# Altium footprint library Connector.PcbLib: 59 footprints (part 1 of 4)
Each footprint in its own frame and in the unit in brackets; x right, y up, seen from the top. Pads: shape width x height; smd on the part's side, far side on the other; paste and mask are expansions set on the pad; w line width, h text height; cw(c..) or ccw(c..) is an arc to the next point about the centre after c.
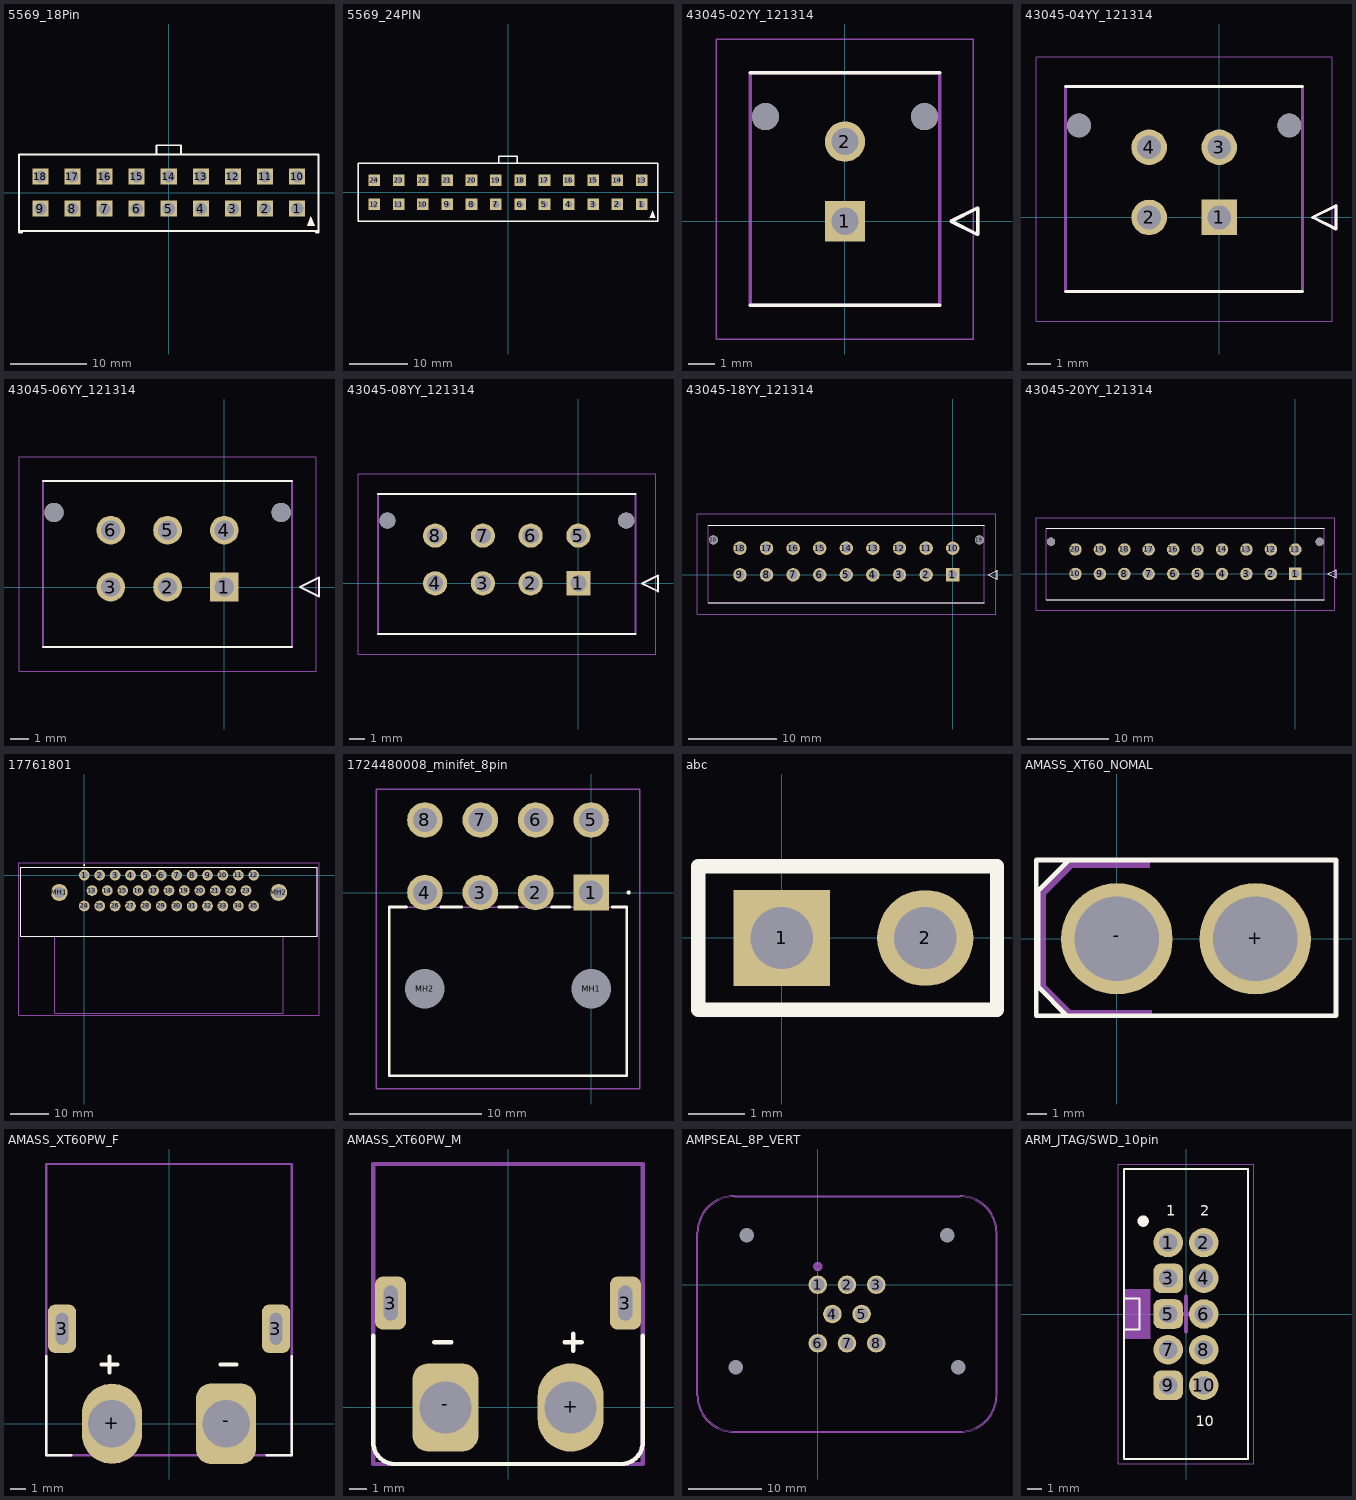
[diagram p0: the footprints below, top view; thin cyan lines are the x and y axes]

## 5569_18Pin [mm] "5569直插18PIN"
pads (18):
  rect 2.1x2.1 hole 1.6: 1(16.8,-2.1) 2(12.6,-2.1) 3(8.4,-2.1) 4(4.2,-2.1) 5(0,-2.1) 6(-4.2,-2.1) 7(-8.4,-2.1) 8(-12.6,-2.1) 9(-16.8,-2.1) 10(16.8,2.1) 11(12.6,2.1) 12(8.4,2.1) 13(4.2,2.1) 14(0,2.1) 15(-4.2,2.1) 16(-8.4,2.1) 17(-12.6,2.1) 18(-16.8,2.1)
Top Overlay:
  region: 18.093,-4.318 19.093,-4.318 18.593,-3.118
  lines w0.254: -19.6,-5 19.6,-5 ; -19.202,-5 -19.202,-5.258 -19.6,-5.258 -19.6,5 19.6,5 19.6,-3.97 ; -1.625,5 -1.625,6.2 1.625,6.2 1.625,5 ; 19.25,-5 19.25,-5.232 19.6,-5.232 19.6,-4
Mechanical 15:
  region: -4.52,2.42 -3.88,2.42 -3.88,1.78 -4.52,1.78
  region: -0.32,2.42 0.32,2.42 0.32,1.78 -0.32,1.78
  region: 3.88,2.42 4.52,2.42 4.52,1.78 3.88,1.78
  region: 3.88,2.42 4.52,2.42 4.52,1.78 3.88,1.78
  region: 8.08,2.42 8.72,2.42 8.72,1.78 8.08,1.78
  region: 12.28,2.42 12.92,2.42 12.92,1.78 12.28,1.78
  region: 16.48,2.42 17.12,2.42 17.12,1.78 16.48,1.78
  region: -17.12,-1.78 -16.48,-1.78 -16.48,-2.42 -17.12,-2.42
  region: -12.92,-1.78 -12.28,-1.78 -12.28,-2.42 -12.92,-2.42
  region: -8.72,-1.78 -8.08,-1.78 -8.08,-2.42 -8.72,-2.42
  region: -4.52,-1.78 -3.88,-1.78 -3.88,-2.42 -4.52,-2.42
  region: -0.32,-1.78 0.32,-1.78 0.32,-2.42 -0.32,-2.42
  region: 3.88,-1.78 4.52,-1.78 4.52,-2.42 3.88,-2.42
  region: 8.08,-1.78 8.72,-1.78 8.72,-2.42 8.08,-2.42
  region: 12.28,-1.78 12.92,-1.78 12.92,-2.42 12.28,-2.42
  region: 16.48,-1.78 17.12,-1.78 17.12,-2.42 16.48,-2.42
  region: -8.72,2.42 -8.08,2.42 -8.08,1.78 -8.72,1.78
  region: -12.92,2.42 -12.28,2.42 -12.28,1.78 -12.92,1.78
  region: 19.66,-5 19.66,-4.975 19.625,-4.94 19.575,-4.94 19.54,-4.975 19.54,-5 19.54,-5.025 19.575,-5.06 19.625,-5.06 19.66,-5.025 19.66,-5
  lines w0.051: -1.626,5 -19.6,5 -19.6,-5 19.6,-5.012 ; -1.626,5.004 -1.626,6.2 1.626,6.2 1.626,5.004 ; 1.626,5 19.6,5 19.6,-5

## 5569_24PIN [mm] "5569直插24pin"
pads (24):
  rect 2x2 hole 1.2 square: 1(23.1,-2.1) 2(18.9,-2.1) 3(14.7,-2.1) 4(10.5,-2.1) 5(6.3,-2.1) 6(2.1,-2.1) 7(-2.1,-2.1) 8(-6.3,-2.1) 9(-10.5,-2.1) 10(-14.7,-2.1) 11(-18.9,-2.1) 12(-23.1,-2.1) 13(23.1,2.1) 14(18.9,2.1) 15(14.7,2.1) 16(10.5,2.1) 17(6.3,2.1) 18(2.1,2.1) 19(-2.1,2.1) 20(-6.3,2.1) 21(-10.5,2.1) 22(-14.7,2.1) 23(-18.9,2.1) 24(-23.1,2.1)
Top Overlay:
  region: 24.468,-4.42 25.468,-4.42 24.968,-3.22
  lines w0.254: -1.625,5 -1.625,6.2 1.625,6.2 1.625,5 ; -25.9,-5 -25.9,5 25.9,5 25.9,-5 -25.9,-5
Mechanical 15:
  region: 19.66,-5 19.66,-4.975 19.625,-4.94 19.575,-4.94 19.54,-4.975 19.54,-5 19.54,-5.025 19.575,-5.06 19.625,-5.06 19.66,-5.025 19.66,-5
  region: 22.78,-1.78 23.42,-1.78 23.42,-2.42 22.78,-2.42
  region: 22.78,2.42 23.42,2.42 23.42,1.78 22.78,1.78
  region: 18.58,-1.78 19.22,-1.78 19.22,-2.42 18.58,-2.42
  region: 18.58,2.42 19.22,2.42 19.22,1.78 18.58,1.78
  region: 14.38,-1.78 15.02,-1.78 15.02,-2.42 14.38,-2.42
  region: 14.38,2.42 15.02,2.42 15.02,1.78 14.38,1.78
  region: 10.18,-1.78 10.82,-1.78 10.82,-2.42 10.18,-2.42
  region: 10.18,2.42 10.82,2.42 10.82,1.78 10.18,1.78
  region: 10.18,2.42 10.82,2.42 10.82,1.78 10.18,1.78
  region: 5.98,-1.78 6.62,-1.78 6.62,-2.42 5.98,-2.42
  region: 5.98,2.42 6.62,2.42 6.62,1.78 5.98,1.78
  region: 1.78,-1.78 2.42,-1.78 2.42,-2.42 1.78,-2.42
  region: 1.78,2.42 2.42,2.42 2.42,1.78 1.78,1.78
  region: -2.42,2.42 -1.78,2.42 -1.78,1.78 -2.42,1.78
  region: -2.42,-1.78 -1.78,-1.78 -1.78,-2.42 -2.42,-2.42
  region: -6.62,2.42 -5.98,2.42 -5.98,1.78 -6.62,1.78
  region: -6.62,-1.78 -5.98,-1.78 -5.98,-2.42 -6.62,-2.42
  region: -10.82,-1.78 -10.18,-1.78 -10.18,-2.42 -10.82,-2.42
  region: -10.82,2.42 -10.18,2.42 -10.18,1.78 -10.82,1.78
  region: -15.02,-1.78 -14.38,-1.78 -14.38,-2.42 -15.02,-2.42
  region: -15.02,2.42 -14.38,2.42 -14.38,1.78 -15.02,1.78
  region: -19.22,-1.78 -18.58,-1.78 -18.58,-2.42 -19.22,-2.42
  region: -19.22,2.42 -18.58,2.42 -18.58,1.78 -19.22,1.78
  region: -23.42,-1.78 -22.78,-1.78 -22.78,-2.42 -23.42,-2.42
  region: -23.42,2.42 -22.78,2.42 -22.78,1.78 -23.42,1.78
  lines w0.051: -1.626,5 -25.908,5 -25.908,-4.998 25.908,-5.014 25.908,5 1.626,5 ; -1.626,5.004 -1.626,6.2 1.626,6.2 1.626,5.004

## 43045-02YY_121314 [mm]
pads (4):
  rect 1.52x1.52 hole 1.02: 1(0,0)
  round 1.52 hole 1.02: 2(0,3)
  round 1.02 hole 1.02 unplated: ""(-3,3.94) ""(3,3.94)
Top Overlay:
  lines w0.127: -3.575,-3.17 3.575,-3.17 ; -3.575,5.6 3.575,5.6 ; 4,0 5,-0.5 5,0.5 4,0
Mechanical 13:
  lines w0.127: -3.575,-3.17 3.575,-3.17 3.575,5.6 -3.575,5.6 -3.575,-3.17 ; 4,0 5,-0.5 5,0.5 4,0
Mechanical 15:
  lines w0.05: -4.845,-4.44 4.845,-4.44 4.845,6.87 -4.845,6.87 -4.845,-4.44
3D body "43045-0212.stp": height 9.46, standoff -3.63, extent -3.575,-2.44 3.575,6.33

## 43045-04YY_121314 [mm]
pads (6):
  rect 1.52x1.52 hole 1.02: 1(0,0)
  round 1.52 hole 1.02: 2(-3,0) 3(0,3) 4(-3,3)
  round 1.02 hole 1.02 unplated: ""(-6,3.94) ""(3,3.94)
Top Overlay:
  lines w0.127: -6.575,-3.17 3.575,-3.17 ; -6.575,5.6 3.575,5.6 ; 4,0 5,0.5 5,-0.5 4,0
Mechanical 13:
  lines w0.127: -6.575,-3.17 -6.575,5.6 3.575,5.6 3.575,-3.17 -6.575,-3.17 ; 4,0 5,0.5 5,-0.5 4,0
Mechanical 15:
  lines w0.05: -7.845,-4.44 -7.845,6.87 4.845,6.87 4.845,-4.44 -7.845,-4.44
3D body "43045-0412.stp": height 9.85, standoff -3.23, extent -6.565,-2.44 3.585,6.33

## 43045-06YY_121314 [mm]
pads (8):
  rect 1.52x1.52 hole 1.02: 1(0,0)
  round 1.52 hole 1.02: 2(-3,0) 3(-6,0) 4(0,3) 5(-3,3) 6(-6,3)
  round 1.02 hole 1.02 unplated: ""(-9,3.94) ""(3,3.94)
Top Overlay:
  lines w0.127: -9.575,-3.17 3.575,-3.17 ; -9.575,5.6 3.575,5.6 ; 4,0 5,-0.5 5,0.5 4,0
Mechanical 13:
  lines w0.127: -9.575,-3.17 3.575,-3.17 3.575,5.6 -9.575,5.6 -9.575,-3.17 ; 4,0 5,-0.5 5,0.5 4,0
Mechanical 15:
  lines w0.05: -10.845,-4.44 4.845,-4.44 4.845,6.87 -10.845,6.87 -10.845,-4.44
3D body "43045-0612.stp": height 9.79, standoff -3.29, extent -9.575,-2.37 3.575,6.4

## 43045-08YY_121314 [mm]
pads (10):
  rect 1.52x1.52 hole 1.02: 1(0,0)
  round 1.52 hole 1.02: 2(-3,0) 3(-6,0) 4(-9,0) 5(0,3) 6(-3,3) 7(-6,3) 8(-9,3)
  round 1.02 hole 1.02 unplated: ""(-12,3.94) ""(3,3.94)
Top Overlay:
  lines w0.127: -12.575,-3.17 3.575,-3.17 ; -12.575,5.6 3.575,5.6 ; 4,0 5,-0.5 5,0.5 4,0
Mechanical 13:
  lines w0.127: -12.575,-3.17 3.575,-3.17 3.575,5.6 -12.575,5.6 -12.575,-3.17 ; 4,0 5,-0.5 5,0.5 4,0
Mechanical 15:
  lines w0.05: -13.845,-4.44 4.845,-4.44 4.845,6.87 -13.845,6.87 -13.845,-4.44
3D body "43045-0812.stp": height 9.83, standoff -3.25, extent -12.575,-2.47 3.575,6.3

## 43045-18YY_121314 [mm]
pads (20):
  rect 1.52x1.52 hole 1.02: 1(0,0)
  round 1.52 hole 1.02: 2(-3,0) 3(-6,0) 4(-9,0) 5(-12,0) 6(-15,0) 7(-18,0) 8(-21,0) 9(-24,0) 10(0,3) 11(-3,3) 12(-6,3) 13(-9,3) 14(-12,3) 15(-15,3) 16(-18,3) 17(-21,3) 18(-24,3)
  round 1.02 hole 1.02 unplated: 19(3,3.94) 20(-27,3.94)
Top Overlay:
  lines w0.127: -27.575,-3.17 3.575,-3.17 ; -27.575,5.6 3.575,5.6 ; 4,0 5,-0.5 5,0.5 4,0
Mechanical 13:
  lines w0.127: -27.575,-3.17 3.575,-3.17 3.575,5.6 -27.575,5.6 -27.575,-3.17 ; 4,0 5,-0.5 5,0.5 4,0
Mechanical 15:
  lines w0.05: -28.845,-4.44 4.845,-4.44 4.845,6.87 -28.845,6.87 -28.845,-4.44
3D body "43045-1812.stp": height 9.75, standoff -3.33, extent -27.405,-3.15 3.745,5.62

## 43045-20YY_121314 [mm]
pads (22):
  rect 1.52x1.52 hole 1.02: 1(0,0)
  round 1.52 hole 1.02: 2(-3,0) 3(-6,0) 4(-9,0) 5(-12,0) 6(-15,0) 7(-18,0) 8(-21,0) 9(-24,0) 10(-27,0) 11(0,3) 12(-3,3) 13(-6,3) 14(-9,3) 15(-12,3) 16(-15,3) 17(-18,3) 18(-21,3) 19(-24,3) 20(-27,3)
  round 1.02 hole 1.02 unplated: 21(3,3.94) 22(-30,3.94)
Top Overlay:
  lines w0.127: -30.575,-3.17 3.575,-3.17 ; -30.575,5.6 3.575,5.6 ; 4,0 5,0.5 5,-0.5 4,0
Mechanical 13:
  lines w0.127: -30.575,-3.17 -30.575,5.6 3.575,5.6 3.575,-3.17 -30.575,-3.17 ; 4,0 5,0.5 5,-0.5 4,0
Mechanical 15:
  lines w0.05: -31.845,-4.44 -31.845,6.87 4.845,6.87 4.845,-4.44 -31.845,-4.44
3D body "43045-2012.stp": height 9.75, standoff -3.33, extent -30.405,-3.15 3.745,5.62

## 17761801 [mm]
pads (37):
  round 2.775 hole 1.85: 1(0,0) 2(4,0) 3(8,0) 4(12,0) 5(16,0) 6(20,0) 7(24,0) 8(28,0) 9(32,0) 10(36,0) 11(40,0) 12(44,0) 13(2,-4) 14(6,-4) 15(10,-4) 16(14,-4) 17(18,-4) 18(22,-4) 19(26,-4) 20(30,-4) 21(34,-4) 22(38,-4) 23(42,-4) 24(0,-8) 25(4,-8) 26(8,-8) 27(12,-8) 28(16,-8) 29(20,-8) 30(24,-8) 31(28,-8) 32(32,-8) 33(36,-8) 34(40,-8) 35(44,-8)
  round 4.395 hole 2.93: MH1(-6.5,-4.5) MH2(50.5,-4.5)
Top Overlay:
  lines w0.1: -16.45,-15.8 -16.45,2.05 60.45,2.05 60.45,-15.8 -16.45,-15.8
  lines w0.2: -0.1,2.6 cw(c0,2.6) 0.1,2.6 cw(c0,2.6) -0.1,2.6
Mechanical 13:
  lines w0.2: -16.45,-15.8 -16.45,2.05 60.45,2.05 60.45,-15.8 -16.45,-15.8 ; -7.7,-35.85 -7.7,-15.8 51.7,-15.8 51.7,-35.85 -7.7,-35.85
Mechanical 15:
  lines w0.1: -16.95,-36.35 -16.95,3.2 60.95,3.2 60.95,-36.35 -16.95,-36.35
3D body "1-776180-1.stp": height 28.1, standoff -4, extent -16.45,-35.67 60.45,2.13
3D body "c-776164-1-f-3d.stp": height 31.8, standoff -2.8, extent -9.856,-68.895 53.544,-35.095

## 1724480008_minifet_8pin [mm]
pads (10):
  rect 2.7x2.7 hole 1.8: 1(0,0)
  round 2.7 hole 1.8: 2(-4.2,0) 3(-8.4,0) 4(-12.6,0) 5(0,5.5) 6(-4.2,5.5) 7(-8.4,5.5) 8(-12.6,5.5)
  round 1.5 hole 3 unplated: MH1(0,-7.3) MH2(-12.6,-7.3)
Top Overlay:
  lines w0.2: -14,-1.1 -15.3,-1.1 -15.3,-13.9 2.7,-13.9 2.7,-1.2 2.7,-1.1 1.6,-1.1 ; -11.4,-1.1 -9.8,-1.1 ; -7,-1.1 -5.6,-1.1 ; -3,-1.1 -1.6,-1.1 ; 2.8,0 ccw(c2.85,0) 2.9,0 ; 2.8,0 cw(c2.85,0) 2.9,0 ; 2.8,0 ccw(c2.85,0) 2.9,0
Mechanical 13:
  lines w0.1: -15.3,-13.9 2.7,-13.9 2.7,-1.1 -15.3,-1.1 -15.3,-13.9
Mechanical 15:
  lines w0.1: -16.3,-14.9 3.7,-14.9 3.7,7.85 -16.3,7.85 -16.3,-14.9
3D body "172448-0008.stp": height 11.17, standoff -3.83, extent -15.2,-13.88 3.197,6.055

## abc [mm]
pads (2):
  rect 1.7x1.7 hole 1.1: 1(0,0)
  round 1.7 hole 1.1: 2(2.54,0)
Top Overlay:
  lines w0.254: -1.48,-1.27 3.81,-1.27 3.81,1.27 -1.48,1.27 -1.48,-1.27
Mechanical 15:
  region: -1.38,-1.25 -1.38,-1.225 -1.415,-1.19 -1.465,-1.19 -1.5,-1.225 -1.5,-1.25 -1.5,-1.275 -1.465,-1.31 -1.415,-1.31 -1.38,-1.275 -1.38,-1.25
  region: 2.22,0.15 2.86,0.15 2.86,-0.15 2.22,-0.15
  region: -0.32,0.15 0.32,0.15 0.32,-0.15 -0.32,-0.15
  lines w0.051: -1.44,-1.25 3.81,-1.25 3.81,1.25 -1.44,1.25 -1.44,-1.25

## AMASS_XT60_NOMAL [mm]
pads (2):
  round 5.8 hole 4.4 paste-2539.97 mask+0.05: +(7.2,0) -(0,0)
Top Overlay:
  lines w0.254: -2.399,-4 -4.2,-4 -4.2,4.1 -2.501,4.1 ; -1.701,4.1 11.4,4.1 11.4,-4 -2.6,-4 -4.099,-2.499 -4.099,2.499 -2.501,4.1 ; -1.599,4.1 -2.501,4.1
Mechanical 6:
  region: 1.7,4.1 -2.5,4.1 -4.1,2.5 -4.1,-2.5 -2.6,-4 1.8,-4 1.8,-3.7 -2.4,-3.7 -3.7,-2.4 -3.7,2.3 -2.3,3.7 1.7,3.7
Mechanical 15:
  region: 8.95,0 8.95,0.172 8.883,0.51 8.751,0.829 8.559,1.116 8.315,1.359 8.029,1.551 7.71,1.683 7.372,1.75 7.027,1.75 6.689,1.683 6.371,1.551 6.084,1.359 5.84,1.116 5.649,0.829 5.517,0.51 5.45,0.172 5.45,0 5.45,-0.172 5.517,-0.51 5.649,-0.829 5.84,-1.116 6.084,-1.359 6.371,-1.551 6.689,-1.683 7.027,-1.75 7.372,-1.75 7.71,-1.683 8.029,-1.551 8.315,-1.359 8.559,-1.116 8.751,-0.829 8.883,-0.51 8.95,-0.172
  region: 1.75,0 1.75,0.172 1.683,0.51 1.551,0.829 1.359,1.116 1.116,1.359 0.829,1.551 0.51,1.683 0.172,1.75 -0.172,1.75 -0.511,1.683 -0.829,1.551 -1.116,1.359 -1.359,1.116 -1.551,0.829 -1.683,0.51 -1.75,0.172 -1.75,0 -1.75,-0.172 -1.683,-0.51 -1.551,-0.829 -1.359,-1.116 -1.116,-1.359 -0.829,-1.551 -0.511,-1.683 -0.172,-1.75 0.172,-1.75 0.51,-1.683 0.829,-1.551 1.116,-1.359 1.359,-1.116 1.551,-0.829 1.683,-0.51 1.75,-0.172
  region: -4.09,-4.05 -4.09,-4.025 -4.125,-3.99 -4.175,-3.99 -4.21,-4.025 -4.21,-4.05 -4.21,-4.075 -4.175,-4.11 -4.125,-4.11 -4.09,-4.075
  lines w0.051: -4.15,-4.05 11.35,-4.05 11.35,4.05 -4.15,4.05 -4.15,-4.05
3D body "User Library-XT60-2.STEP": height 15.7, standoff -4.5, extent -4.092,-4.011 11.408,4.089
3D body "User Library-XT60.STEP": height 37.12, standoff 15.12, extent -4.343,-3.937 11.592,4.191

## AMASS_XT60PW_F [mm]
pads (4):
  rrect50% 1.778x3.048 hole 0.8 slot 2 at 90 deg: 3(-6.75,6) 3(6.75,6)
  oval 3.81x5.08 hole 3: +(-3.6,0)
  rrect50% 3.81x5.08 hole 3: -(3.6,0)
Top Overlay:
  lines w0.152: -7.75,4.25 -7.75,-2 -6.175,-2 ; 6.175,-2 7.75,-2 7.75,4.25
  lines w0.254: -4.25,3.75 -3.25,3.75 ; -3.75,3.25 -3.75,4.25 ; 3.25,3.75 4.25,3.75
Mechanical 13:
  lines w0.152: -7.75,-2 -7.75,16.4 0,16.4 7.75,16.4 7.75,-2 0,-2 -7.75,-2
3D body "XT60 MALE.STEP": height 8.15, standoff 0.05, extent -7.75,10.3 7.75,30
3D body "XT60PW FEMALE.STEP": height 8.15, standoff -1.95, extent -7.75,-2 7.75,16.4

## AMASS_XT60PW_M [mm]
pads (4):
  rrect50% 1.778x3.048 hole 0.8 slot 2 at 90 deg: 3(-6.75,6) 3(6.75,6)
  oval 3.81x5.08 hole 3: +(3.6,0)
  rrect50% 3.81x5.08 hole 3: -(-3.6,0)
Top Overlay:
  lines w0.254: -7.75,4.125 -7.75,-2 ccw(c-6.5,-2) -6.5,-3.25 0,-3.25 6.5,-3.25 ccw(c6.5,-2) 7.75,-2 7.75,4.125 ; -4.25,3.75 -3.25,3.75 ; 3.25,3.75 4.25,3.75 ; 3.75,3.25 3.75,4.25
Mechanical 13:
  lines w0.254: -7.75,-3.25 -7.75,14 0,14 7.75,14 7.75,-3.25 0,-3.25 -7.75,-3.25
3D body "XT60PW MALE.STEP": height 9, standoff -1.4, extent -7.75,-2.95 7.75,15.25
3D body "XT60 FEMALE.STEP": height 8.15, standoff 0.05, extent -7.75,10.8 7.75,31.7

## AMPSEAL_8P_VERT [mm]
pads (12):
  round 2.54 hole 1.8: 1(0,0) 2(4,0) 3(8,0) 4(2,-4) 5(6,-4) 6(0,-8) 7(4,-8) 8(8,-8)
  round 0 hole 2 unplated mask+0.102: 9(-9.7,6.8) 10(17.7,6.8) 11(-11.2,-11.3) 12(19.2,-11.3)
Mechanical 5:
  lines w0.152: -16.527,-15.18 ccw(c-11.523,-15.18) -11.523,-20.184 19.523,-20.184 ccw(c19.523,-15.18) 24.527,-15.18 24.527,7.18 ccw(c19.523,7.18) 19.523,12.184 -11.523,12.184 ccw(c-11.523,7.18) -16.527,7.18 -16.527,-15.18
Mechanical 13:
  circle w0.508: c0,2.5 r0.381
  lines w0: -16.4,-15.053 ccw(c-11.396,-15.053) -11.396,-20.057 ; -16.4,7.053 cw(c-11.396,7.053) -11.396,12.057 ; 19.396,-20.057 ccw(c19.396,-15.053) 24.4,-15.053 ; 19.396,12.057 cw(c19.396,7.053) 24.4,7.053
  lines w0.025: -16.4,-15.053 -16.4,7.053 ; -11.396,-20.057 19.396,-20.057 ; -11.396,12.057 19.396,12.057 ; 24.4,-15.053 24.4,7.053
3D body "c-1-776276-1-d-3d.stp": height 34.4, standoff -3.65, extent -16.4,-20.05 24.4,12.05

## ARM_JTAG/SWD_10pin [mm]
pads (10):
  round 2.1 hole 1.3: 1(-1.27,5.08) 2(1.27,5.08) 4(1.27,2.54) 6(1.27,0) 7(-1.27,-2.54) 8(1.27,-2.54) 10(1.27,-5.08)
  rrect50% 2.1x2.1 hole 1.3: 3(-1.27,2.54) 5(-1.27,0) 9(-1.27,-5.08)
Top Overlay:
  circle w0.4: c-3.048,6.604 r0.2
  lines w0.152: -4.4,-1.11 -3.302,-1.11 -3.302,0 -3.302,1.11 -4.4,1.11 ; -4.4,-10.3 -4.4,10.3 ; -4.4,-10.3 -4.4,10.3 ; -4.4,-10.3 4.4,-10.3 ; -4.4,-10.3 4.4,-10.3 ; -4.4,10.3 4.4,10.3 ; -4.4,10.3 4.4,10.3 ; 4.4,-10.3 4.4,10.3 ; 4.4,-10.3 4.4,10.3
  text "1" at -1.397,6.985 h0.76
  text "2" at 1.016,6.985 h0.76
  text "10" at 0.699,-8.001 h0.76
Mechanical 13:
  rectangle: -4.4,0 -2.54,1.771
  rectangle: -4.4,-1.771 -2.54,0
  text "1" at -1.397,6.985 h0.76
  text "2" at 1.016,6.985 h0.76
  text "10" at 0.699,-8.001 h0.76
Mechanical 15:
  lines w0.05: -4.826,-10.668 -4.826,10.668 4.826,10.668 4.826,-10.668 4.064,-10.668 -4.826,-10.668
  lines w0.254: -1.27,0 1.27,0 ; 0,-1.27 0,1.27
3D body "User Library-BoxHeader_2R5W_254P_00D.step": height 9.1, standoff -3.1, extent -4.4,-10.3 4.4,10.3